# Altium footprint library MOTHER_BOARD_LS1021_v1.0.PcbLib: 69 footprints (part 1 of 5)
Each footprint in its own frame and in the unit in brackets; x right, y up, seen from the top. Pads: shape width x height; smd on the part's side, far side on the other; paste and mask are expansions set on the pad; w line width, h text height; cw(c..) or ccw(c..) is an arc to the next point about the centre after c.
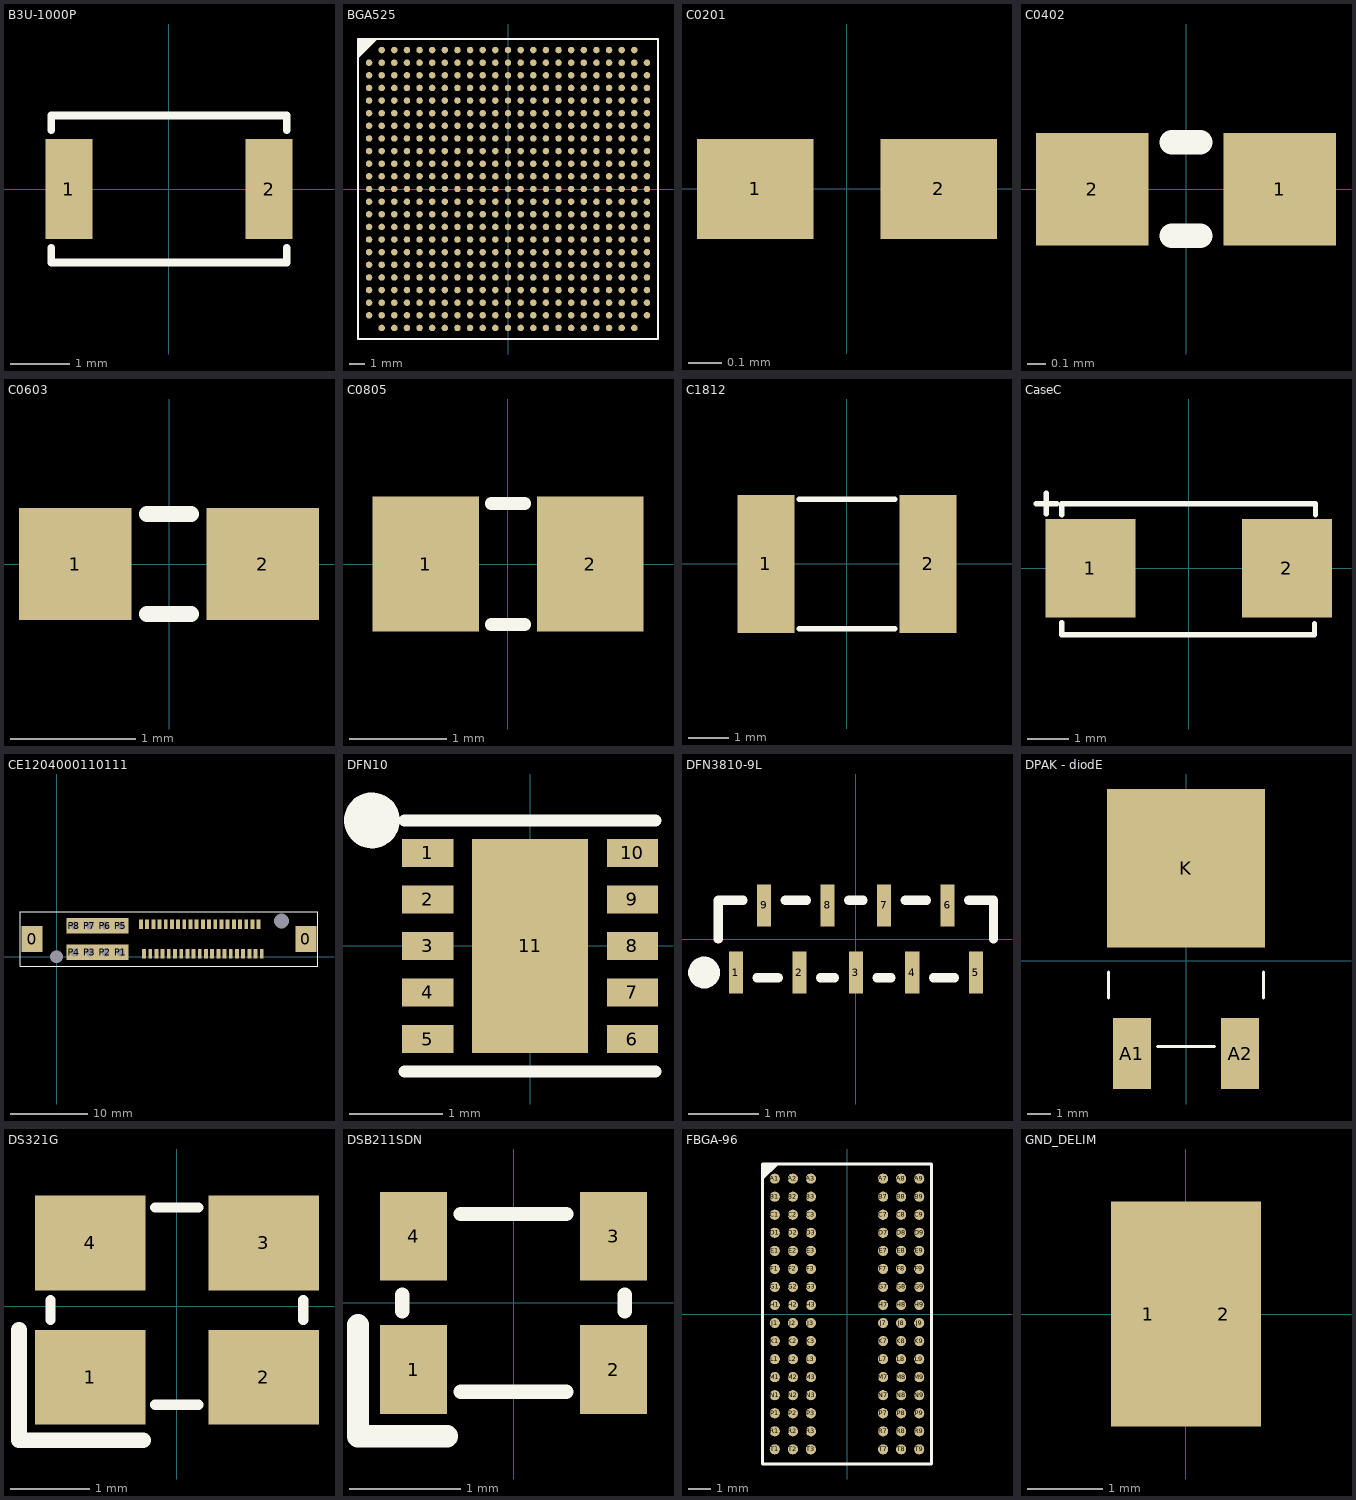
[diagram p0: the footprints below, top view; thin cyan lines are the x and y axes]

## B3U-1000P [mm]
height 14.5
pads (2):
  rect 0.8x1.7 smd paste+0 mask+0.05: 1(-1.7,0) 2(1.7,0)
Top Overlay:
  lines w0.13: -2,-1 -2,-1.25 2,-1.25 ; -2,1 -2,1.25 ; 2,-1 2,-1.25 ; 2,1 2,1.25 -2,1.25 ; -2,1.25 -2,1.25 ; 2,-1.25 2,-1.25
3D body "OMRON B3U1000P.step": height 1.6, standoff 0, extent -2,-1.25 2,1.25

## BGA525 [mm]
height 1.9
pads (525):
  round 0.41 smd paste-0.02 mask+0.05: A2(-8,8.8) A3(-7.2,8.8) A4(-6.4,8.8) A5(-5.6,8.8) A6(-4.8,8.8) A7(-4,8.8) A8(-3.2,8.8) A9(-2.4,8.8) A10(-1.6,8.8) A11(-0.8,8.8) A12(0,8.8) A13(0.8,8.8) A14(1.6,8.8) A15(2.4,8.8) A16(3.2,8.8) A17(4,8.8) A18(4.8,8.8) A19(5.6,8.8) A20(6.4,8.8) A21(7.2,8.8) A22(8,8.8) AA1(-8.8,-7.2) AA2(-8,-7.2) AA3(-7.2,-7.2) AA4(-6.4,-7.2) AA5(-5.6,-7.2) AA6(-4.8,-7.2) AA7(-4,-7.2) AA8(-3.2,-7.2) AA9(-2.4,-7.2) AA10(-1.6,-7.2) AA11(-0.8,-7.2) AA12(0,-7.2) AA13(0.8,-7.2) AA14(1.6,-7.2) AA15(2.4,-7.2) AA16(3.2,-7.2) AA17(4,-7.2) AA18(4.8,-7.2) AA19(5.6,-7.2) AA20(6.4,-7.2) AA21(7.2,-7.2) AA22(8,-7.2) AA23(8.8,-7.2) AB1(-8.8,-8) AB2(-8,-8) AB3(-7.2,-8) AB4(-6.4,-8) AB5(-5.6,-8) AB6(-4.8,-8) AB7(-4,-8) AB8(-3.2,-8) AB9(-2.4,-8) AB10(-1.6,-8) AB11(-0.8,-8) AB12(0,-8) AB13(0.8,-8) AB14(1.6,-8) AB15(2.4,-8) AB16(3.2,-8) AB17(4,-8) AB18(4.8,-8) AB19(5.6,-8) AB20(6.4,-8) AB21(7.2,-8) AB22(8,-8) AB23(8.8,-8) AC2(-8,-8.8) AC3(-7.2,-8.8) AC4(-6.4,-8.8) AC5(-5.6,-8.8) AC6(-4.8,-8.8) AC7(-4,-8.8) AC8(-3.2,-8.8) AC9(-2.4,-8.8) AC10(-1.6,-8.8) AC11(-0.8,-8.8) AC12(0,-8.8) AC13(0.8,-8.8) AC14(1.6,-8.8) AC15(2.4,-8.8) AC16(3.2,-8.8) AC17(4,-8.8) AC18(4.8,-8.8) AC19(5.6,-8.8) AC20(6.4,-8.8) AC21(7.2,-8.8) AC22(8,-8.8) B1(-8.8,8) B2(-8,8) B3(-7.2,8) B4(-6.4,8) B5(-5.6,8) B6(-4.8,8) B7(-4,8) B8(-3.2,8) B9(-2.4,8) B10(-1.6,8) B11(-0.8,8) B12(0,8) B13(0.8,8) B14(1.6,8) B15(2.4,8) B16(3.2,8) B17(4,8) B18(4.8,8) B19(5.6,8) B20(6.4,8) B21(7.2,8) B22(8,8) B23(8.8,8) C1(-8.8,7.2) C2(-8,7.2) C3(-7.2,7.2) C4(-6.4,7.2) C5(-5.6,7.2) C6(-4.8,7.2) C7(-4,7.2) C8(-3.2,7.2) C9(-2.4,7.2) C10(-1.6,7.2) C11(-0.8,7.2) C12(0,7.2) C13(0.8,7.2) C14(1.6,7.2) C15(2.4,7.2) C16(3.2,7.2) C17(4,7.2) C18(4.8,7.2) C19(5.6,7.2) C20(6.4,7.2) C21(7.2,7.2) C22(8,7.2) C23(8.8,7.2) D1(-8.8,6.4) D2(-8,6.4) D3(-7.2,6.4) D4(-6.4,6.4) D5(-5.6,6.4) D6(-4.8,6.4) D7(-4,6.4) D8(-3.2,6.4) D9(-2.4,6.4) D10(-1.6,6.4) D11(-0.8,6.4) D12(0,6.4) D13(0.8,6.4) D14(1.6,6.4) D15(2.4,6.4) D16(3.2,6.4) D17(4,6.4) D18(4.8,6.4) D19(5.6,6.4) D20(6.4,6.4) D21(7.2,6.4) D22(8,6.4) D23(8.8,6.4) E1(-8.8,5.6) E2(-8,5.6) E3(-7.2,5.6) E4(-6.4,5.6) E5(-5.6,5.6) E6(-4.8,5.6) E7(-4,5.6) E8(-3.2,5.6) E9(-2.4,5.6) E10(-1.6,5.6) E11(-0.8,5.6) E12(0,5.6) E13(0.8,5.6) E14(1.6,5.6) E15(2.4,5.6) E16(3.2,5.6) E17(4,5.6) E18(4.8,5.6) E19(5.6,5.6) E20(6.4,5.6) E21(7.2,5.6) E22(8,5.6) E23(8.8,5.6) F1(-8.8,4.8) F2(-8,4.8) F3(-7.2,4.8) F4(-6.4,4.8) F5(-5.6,4.8) F6(-4.8,4.8) F7(-4,4.8) F8(-3.2,4.8) F9(-2.4,4.8) F10(-1.6,4.8) F11(-0.8,4.8) F12(0,4.8) F13(0.8,4.8) F14(1.6,4.8) F15(2.4,4.8) F16(3.2,4.8) F17(4,4.8) F18(4.8,4.8) F19(5.6,4.8) F20(6.4,4.8) F21(7.2,4.8) F22(8,4.8) F23(8.8,4.8) G1(-8.8,4) G2(-8,4) G3(-7.2,4) G4(-6.4,4) G5(-5.6,4) G6(-4.8,4) G7(-4,4) G8(-3.2,4) G9(-2.4,4) G10(-1.6,4) G11(-0.8,4) G12(0,4) G13(0.8,4) G14(1.6,4) G15(2.4,4) G16(3.2,4) G17(4,4) G18(4.8,4) G19(5.6,4) G20(6.4,4) G21(7.2,4) G22(8,4) G23(8.8,4) H1(-8.8,3.2) H2(-8,3.2) H3(-7.2,3.2) H4(-6.4,3.2) H5(-5.6,3.2) H6(-4.8,3.2) H7(-4,3.2) H8(-3.2,3.2) H9(-2.4,3.2) H10(-1.6,3.2) H11(-0.8,3.2) H12(0,3.2) H13(0.8,3.2) H14(1.6,3.2) H15(2.4,3.2) H16(3.2,3.2) H17(4,3.2) H18(4.8,3.2) H19(5.6,3.2) H20(6.4,3.2) H21(7.2,3.2) H22(8,3.2) H23(8.8,3.2) J1(-8.8,2.4) J2(-8,2.4) J3(-7.2,2.4) J4(-6.4,2.4) J5(-5.6,2.4) J6(-4.8,2.4) J7(-4,2.4) J8(-3.2,2.4) J9(-2.4,2.4) J10(-1.6,2.4) J11(-0.8,2.4) J12(0,2.4) J13(0.8,2.4) J14(1.6,2.4) J15(2.4,2.4) J16(3.2,2.4) J17(4,2.4) J18(4.8,2.4) J19(5.6,2.4) J20(6.4,2.4) J21(7.2,2.4) J22(8,2.4) J23(8.8,2.4) K1(-8.8,1.6) K2(-8,1.6) K3(-7.2,1.6) K4(-6.4,1.6) K5(-5.6,1.6) K6(-4.8,1.6) K7(-4,1.6) K8(-3.2,1.6) K9(-2.4,1.6) K10(-1.6,1.6) K11(-0.8,1.6) K12(0,1.6) K13(0.8,1.6) K14(1.6,1.6) K15(2.4,1.6) K16(3.2,1.6) K17(4,1.6) K18(4.8,1.6) K19(5.6,1.6) K20(6.4,1.6) K21(7.2,1.6) K22(8,1.6) K23(8.8,1.6) L1(-8.8,0.8) L2(-8,0.8) L3(-7.2,0.8) L4(-6.4,0.8) L5(-5.6,0.8) L6(-4.8,0.8) L7(-4,0.8) L8(-3.2,0.8) L9(-2.4,0.8) L10(-1.6,0.8) L11(-0.8,0.8) L12(0,0.8) L13(0.8,0.8) L14(1.6,0.8) L15(2.4,0.8) L16(3.2,0.8) L17(4,0.8) L18(4.8,0.8) L19(5.6,0.8) L20(6.4,0.8) L21(7.2,0.8) L22(8,0.8) L23(8.8,0.8) M1(-8.8,0) M2(-8,0) M3(-7.2,0) M4(-6.4,0) M5(-5.6,0) M6(-4.8,0) M7(-4,0) M8(-3.2,0) M9(-2.4,0) M10(-1.6,0) M11(-0.8,0) M12(0,0) M13(0.8,0) M14(1.6,0) M15(2.4,0) M16(3.2,0) M17(4,0) M18(4.8,0) M19(5.6,0) M20(6.4,0) M21(7.2,0) M22(8,0) M23(8.8,0) N1(-8.8,-0.8) N2(-8,-0.8) N3(-7.2,-0.8) N4(-6.4,-0.8) N5(-5.6,-0.8) N6(-4.8,-0.8) N7(-4,-0.8) N8(-3.2,-0.8) N9(-2.4,-0.8) N10(-1.6,-0.8) N11(-0.8,-0.8) N12(0,-0.8) N13(0.8,-0.8) N14(1.6,-0.8) N15(2.4,-0.8) N16(3.2,-0.8) N17(4,-0.8) N18(4.8,-0.8) N19(5.6,-0.8) N20(6.4,-0.8) N21(7.2,-0.8) N22(8,-0.8) N23(8.8,-0.8) P1(-8.8,-1.6) P2(-8,-1.6) P3(-7.2,-1.6) P4(-6.4,-1.6) P5(-5.6,-1.6) P6(-4.8,-1.6) P7(-4,-1.6) P8(-3.2,-1.6) P9(-2.4,-1.6) P10(-1.6,-1.6) P11(-0.8,-1.6) P12(0,-1.6) P13(0.8,-1.6) P14(1.6,-1.6) P15(2.4,-1.6) P16(3.2,-1.6) P17(4,-1.6) P18(4.8,-1.6) P19(5.6,-1.6) P20(6.4,-1.6) P21(7.2,-1.6) P22(8,-1.6) P23(8.8,-1.6) R1(-8.8,-2.4) R2(-8,-2.4) R3(-7.2,-2.4) R4(-6.4,-2.4) R5(-5.6,-2.4) R6(-4.8,-2.4) R7(-4,-2.4) R8(-3.2,-2.4) R9(-2.4,-2.4) R10(-1.6,-2.4) R11(-0.8,-2.4) R12(0,-2.4) R13(0.8,-2.4) R14(1.6,-2.4) R15(2.4,-2.4) R16(3.2,-2.4) R17(4,-2.4) R18(4.8,-2.4) R19(5.6,-2.4) R20(6.4,-2.4) R21(7.2,-2.4) R22(8,-2.4) R23(8.8,-2.4) T1(-8.8,-3.2) T2(-8,-3.2) T3(-7.2,-3.2) T4(-6.4,-3.2) T5(-5.6,-3.2) T6(-4.8,-3.2) T7(-4,-3.2) T8(-3.2,-3.2) T9(-2.4,-3.2) T10(-1.6,-3.2) T11(-0.8,-3.2) T12(0,-3.2) T13(0.8,-3.2) T14(1.6,-3.2) T15(2.4,-3.2) T16(3.2,-3.2) T17(4,-3.2) T18(4.8,-3.2) T19(5.6,-3.2) T20(6.4,-3.2) T21(7.2,-3.2) T22(8,-3.2) T23(8.8,-3.2) U1(-8.8,-4) U2(-8,-4) U3(-7.2,-4) U4(-6.4,-4) U5(-5.6,-4) U6(-4.8,-4) U7(-4,-4) U8(-3.2,-4) U9(-2.4,-4) U10(-1.6,-4) U11(-0.8,-4) U12(0,-4) U13(0.8,-4) U14(1.6,-4) U15(2.4,-4) U16(3.2,-4) U17(4,-4) U18(4.8,-4) U19(5.6,-4) U20(6.4,-4) U21(7.2,-4) U22(8,-4) U23(8.8,-4) V1(-8.8,-4.8) V2(-8,-4.8) V3(-7.2,-4.8) V4(-6.4,-4.8) V5(-5.6,-4.8) V6(-4.8,-4.8) V7(-4,-4.8) V8(-3.2,-4.8) V9(-2.4,-4.8) V10(-1.6,-4.8) V11(-0.8,-4.8) V12(0,-4.8) V13(0.8,-4.8) V14(1.6,-4.8) V15(2.4,-4.8) V16(3.2,-4.8) V17(4,-4.8) V18(4.8,-4.8) V19(5.6,-4.8) V20(6.4,-4.8) V21(7.2,-4.8) V22(8,-4.8) V23(8.8,-4.8) W1(-8.8,-5.6) W2(-8,-5.6) W3(-7.2,-5.6) W4(-6.4,-5.6) W5(-5.6,-5.6) W6(-4.8,-5.6) W7(-4,-5.6) W8(-3.2,-5.6) W9(-2.4,-5.6) W10(-1.6,-5.6) W11(-0.8,-5.6) W12(0,-5.6) W13(0.8,-5.6) W14(1.6,-5.6) W15(2.4,-5.6) W16(3.2,-5.6) W17(4,-5.6) W18(4.8,-5.6) W19(5.6,-5.6) W20(6.4,-5.6) W21(7.2,-5.6) W22(8,-5.6) W23(8.8,-5.6) Y1(-8.8,-6.4) Y2(-8,-6.4) Y3(-7.2,-6.4) Y4(-6.4,-6.4) Y5(-5.6,-6.4) Y6(-4.8,-6.4) Y7(-4,-6.4) Y8(-3.2,-6.4) Y9(-2.4,-6.4) Y10(-1.6,-6.4) Y11(-0.8,-6.4) Y12(0,-6.4) Y13(0.8,-6.4) Y14(1.6,-6.4) Y15(2.4,-6.4) Y16(3.2,-6.4) Y17(4,-6.4) Y18(4.8,-6.4) Y19(5.6,-6.4) Y20(6.4,-6.4) Y21(7.2,-6.4) Y22(8,-6.4) Y23(8.8,-6.4)
Top Overlay:
  region: -8.28,9.5 -9.5,8.28 -9.5,9.5
  lines w0.13: -9.5,-9.5 -9.5,9.5 9.5,9.5 9.5,-9.5 -9.5,-9.5
3D body: height 1.9, standoff 0.3, extent -9.5,-9.5 9.5,9.5

## C0201 [mm]
height 0.2
pads (2):
  rect 0.35x0.3 smd paste-3 mask+0.05: 1(-0.275,0) 2(0.275,0)
Top Paste:
  region: 0.45,-0.15 0.22,-0.15 0.1,0 0.22,0.15 0.45,0.15
  region: -0.45,0.15 -0.22,0.15 -0.1,0 -0.22,-0.15 -0.45,-0.15
3D body: height 0.2, standoff 0, extent -0.3,-0.15 0.3,0.15

## C0402 [mm]
height 0.5
pads (2):
  rect 0.6x0.6 smd paste-0.05 mask+0.05: 1(0.5,0) 2(-0.5,0)
Top Overlay:
  lines w0.13: -0.075,-0.25 0.075,-0.25 ; -0.075,0.25 0.075,0.25
3D body "0402.STEP": height 0.6, standoff 0, extent -0.5,-0.25 0.5,0.25

## C0603 [mm]
height 0.85
pads (2):
  rect 0.9x0.9 smd paste-0.05 mask+0.05: 1(-0.75,0) 2(0.75,0)
Top Overlay:
  lines w0.13: -0.175,-0.4 0.175,-0.4 ; -0.175,0.4 0.175,0.4
3D body: height 0.5, standoff 0, extent -0.8,-0.4 0.8,0.4

## C0805 [mm]
height 1.25
pads (2):
  rect 1.1x1.4 smd paste-0.05 mask+0.05: 1(-0.85,0) 2(0.85,0)
Top Overlay:
  lines w0.13: -0.175,-0.625 0.175,-0.625 ; -0.175,0.625 0.175,0.625
3D body "C0805.step": height 1, standoff 0, extent -1,-0.625 1,0.625

## C1812 [mm]
height 1.35
pads (2):
  rect 1.4x3.4 smd paste-0.05 mask+0.05: 1(-2,0) 2(2,0)
Top Overlay:
  lines w0.13: -1.175,-1.6 1.175,-1.6 ; -1.175,1.6 1.175,1.6
3D body "C1812.step": height 1.6, standoff 0, extent -2.25,-1.6 2.25,1.6

## CaseC [mm]
height 14.5
pads (2):
  rect 2.2x2.4 smd paste-0.05 mask+0.05: 1(-2.4,0) 2(2.4,0)
Top Overlay:
  lines w0.13: -3.729,1.58 -3.221,1.58 ; -3.475,1.326 -3.475,1.834 ; -3.1,-1.325 -3.1,-1.625 3.075,-1.625 3.075,-1.35 ; -3.1,1.3 -3.1,1.58 3.1,1.58 3.1,1.3
3D body "Tantalum Capacitor Case C.STEP": height 2.67, standoff -0.02, extent -3.093,-1.63 3.092,1.575

## CE1204000110111 [mm]
height 11.3
pads (52):
  rect 2.7x3.4 smd paste-0.1 mask+0.05: 0(-3.15,2.3) 0(32.2,2.3)
  rect 0.5x1.2 smd paste-0.05 mask+0.05: 1(11.3,0.4) 2(10.9,4.2) 3(12.1,0.4) 4(11.7,4.2) 5(12.9,0.4) 6(12.5,4.2) 7(13.7,0.4) 8(13.3,4.2) 9(14.5,0.4) 10(14.1,4.2) 11(15.3,0.4) 12(14.9,4.2) 13(16.1,0.4) 14(15.7,4.2) 15(16.9,0.4) 16(16.5,4.2) 17(17.7,0.4) 18(17.3,4.2) 19(18.5,0.4) 20(18.1,4.2) 21(19.3,0.4) 22(18.9,4.2) 23(20.1,0.4) 24(19.7,4.2) 25(20.9,0.4) 26(20.5,4.2) 27(21.7,0.4) 28(21.3,4.2) 29(22.5,0.4) 30(22.1,4.2) 31(23.3,0.4) 32(22.9,4.2) 33(24.1,0.4) 34(23.7,4.2) 35(24.9,0.4) 36(24.5,4.2) 37(25.7,0.4) 38(25.3,4.2) 39(26.5,0.4) 40(26.1,4.2)
  rect 0x0 hole 1.65 unplated paste+0 mask+0.05: MO(0,0)
  rect 0x0 hole 1.95 unplated paste+0 mask+0.05: MO(29.05,4.6)
  rect 2x2 hole 1 paste+0 mask+0.1: P1(8.3,0.57) P2(6.3,0.57) P3(4.3,0.57) P4(2.3,0.57) P5(8.3,4.03) P6(6.3,4.03) P7(4.3,4.03) P8(2.3,4.03)
Top Overlay:
  lines w0.13: -4.675,-1.2 -4.675,5.8 33.725,5.8 33.725,-1.2 -4.675,-1.2
3D body "CE1204000110111.stp": height 11.3, standoff -3.2, extent -4.3,-1.2 33.35,5.8

## DFN10 [mm]
height 14.5
pads (11):
  rect 0.55x0.3 smd paste-0.03 mask+0.05: 1(-1.1,1) 2(-1.1,0.5) 3(-1.1,0) 4(-1.1,-0.5) 5(-1.1,-1) 6(1.1,-1) 7(1.1,-0.5) 8(1.1,0) 9(1.1,0.5) 10(1.1,1)
  rect 1.25x2.3 smd paste-0.05 mask+0.05: 11(0,0)
Top Overlay:
  circle w0.3: c-1.7,1.35 r0.15
  lines w0.13: -1.35,-1.35 1.35,-1.35 ; -1.35,1.35 1.35,1.35
3D body: height 0.55, standoff 0, extent -1.35,-1.35 1.35,1.35

## DFN3810-9L [mm] "WE 824014881"
height 0.55
pads (9):
  rect 0.2x0.6 smd paste+0 mask+0.05: 1(-1.7,-0.475) 2(-0.8,-0.475) 3(0,-0.475) 4(0.8,-0.475) 5(1.7,-0.475) 6(1.3,0.475) 7(0.4,0.475) 8(-0.4,0.475) 9(-1.3,0.475)
Top Overlay:
  circle w0.25: c-2.15,-0.475 r0.1
  lines w0.13: -1.95,0 -1.95,0.55 -1.6,0.55 ; -1.4,-0.55 -1.1,-0.55 ; -1,0.55 -0.7,0.55 ; -0.5,-0.55 -0.3,-0.55 ; -0.1,0.55 0.1,0.55 ; 0.3,-0.55 0.5,-0.55 ; 0.7,0.55 1,0.55 ; 1.1,-0.55 1.4,-0.55 ; 1.6,0.55 1.95,0.55 1.95,0
3D body "DFN3810-9L_82401488x.stp": height 0.5, standoff 0, extent -1.9,-0.5 1.9,0.5

## DPAK - diodE [mm] "STPS15L45CB"
height 14.5
pads (3):
  rect 1.6x3 smd paste-0.1 mask+0.05: A1(-2.286,-3.925) A2(2.286,-3.925)
  rect 6.7x6.7 smd paste-0.1 mask+0.05: K(0,3.925)
Top Overlay:
  lines w0.13: -3.275,-1.575 -3.275,-0.475 ; -1.2,-3.625 1.2,-3.625 ; 3.275,-1.575 3.275,-0.475
3D body "DPAK.step": height 2.39, standoff -0.02, extent -3.27,-4.736 3.27,5.203

## DS321G [mm]
height 14.5
pads (4):
  rect 1.4x1.2 smd paste-0.05 mask+0.05: 1(-1.1,-0.9) 2(1.1,-0.9) 3(1.1,0.8) 4(-1.1,0.8)
Top Overlay:
  lines w0.13: -1.6,-0.175 -1.6,0.075 ; -0.275,-1.25 0.275,-1.25 ; -0.275,1.25 0.275,1.25 ; 1.6,-0.175 1.6,0.075
  lines w0.2: -2,-0.3 -2,-1.7 -0.425,-1.7
3D body: height 0.85, standoff 0, extent -1.6,-1.25 1.6,1.25

## DSB211SDN [mm]
height 0.7
pads (4):
  rect 0.6x0.8 smd paste-0.05 mask+0.05: 1(-0.9,-0.6) 2(0.9,-0.6) 3(0.9,0.6) 4(-0.9,0.6)
Top Overlay:
  lines w0.13: -1,-0.075 -1,0.075 ; -0.475,-0.8 0.475,-0.8 ; -0.475,0.8 0.475,0.8 ; 1,-0.075 1,0.075
  lines w0.2: -1.4,-0.2 -1.4,-1.2 -0.6,-1.2
3D body: height 0.7, standoff 0, extent -1,-0.8 1,0.8

## FBGA-96 [mm]
height 5.51
pads (96):
  round 0.45 smd paste-0.02 mask+0.05: A1(-3.2,6) A2(-2.4,6) A3(-1.6,6) A7(1.6,6) A8(2.4,6) A9(3.2,6) B1(-3.2,5.2) B2(-2.4,5.2) B3(-1.6,5.2) B7(1.6,5.2) B8(2.4,5.2) B9(3.2,5.2) C1(-3.2,4.4) C2(-2.4,4.4) C3(-1.6,4.4) C7(1.6,4.4) C8(2.4,4.4) C9(3.2,4.4) D1(-3.2,3.6) D2(-2.4,3.6) D3(-1.6,3.6) D7(1.6,3.6) D8(2.4,3.6) D9(3.2,3.6) E1(-3.2,2.8) E2(-2.4,2.8) E3(-1.6,2.8) E7(1.6,2.8) E8(2.4,2.8) E9(3.2,2.8) F1(-3.2,2) F2(-2.4,2) F3(-1.6,2) F7(1.6,2) F8(2.4,2) F9(3.2,2) G1(-3.2,1.2) G2(-2.4,1.2) G3(-1.6,1.2) G7(1.6,1.2) G8(2.4,1.2) G9(3.2,1.2) H1(-3.2,0.4) H2(-2.4,0.4) H3(-1.6,0.4) H7(1.6,0.4) H8(2.4,0.4) H9(3.2,0.4) J1(-3.2,-0.4) J2(-2.4,-0.4) J3(-1.6,-0.4) J7(1.6,-0.4) J8(2.4,-0.4) J9(3.2,-0.4) K1(-3.2,-1.2) K2(-2.4,-1.2) K3(-1.6,-1.2) K7(1.6,-1.2) K8(2.4,-1.2) K9(3.2,-1.2) L1(-3.2,-2) L2(-2.4,-2) L3(-1.6,-2) L7(1.6,-2) L8(2.4,-2) L9(3.2,-2) M1(-3.2,-2.8) M2(-2.4,-2.8) M3(-1.6,-2.8) M7(1.6,-2.8) M8(2.4,-2.8) M9(3.2,-2.8) N1(-3.2,-3.6) N2(-2.4,-3.6) N3(-1.6,-3.6) N7(1.6,-3.6) N8(2.4,-3.6) N9(3.2,-3.6) P1(-3.2,-4.4) P2(-2.4,-4.4) P3(-1.6,-4.4) P7(1.6,-4.4) P8(2.4,-4.4) P9(3.2,-4.4) R1(-3.2,-5.2) R2(-2.4,-5.2) R3(-1.6,-5.2) R7(1.6,-5.2) R8(2.4,-5.2) R9(3.2,-5.2) T1(-3.2,-6) T2(-2.4,-6) T3(-1.6,-6) T7(1.6,-6) T8(2.4,-6) T9(3.2,-6)
Top Overlay:
  region: -3.75,5.925 -3.75,6.65 -3.025,6.65
  lines w0.13: -3.75,-6.65 3.75,-6.65 3.75,6.65 -3.75,6.65 -3.75,-6.65
3D body: height 1.1, standoff 0.37, extent -3.75,-6.65 3.75,6.65

## GND_DELIM [mm]
height 14.5
pads (2):
  rect 1x3 smd paste-5 mask-5: 1(-0.5,0) 2(0.5,0)